# Altium footprint library PcbLib.PcbLib: 68 footprints (part 5 of 5)
Each footprint in its own frame and in the unit in brackets; x right, y up, seen from the top. Pads: shape width x height; smd on the part's side, far side on the other; paste and mask are expansions set on the pad; w line width, h text height; cw(c..) or ccw(c..) is an arc to the next point about the centre after c.
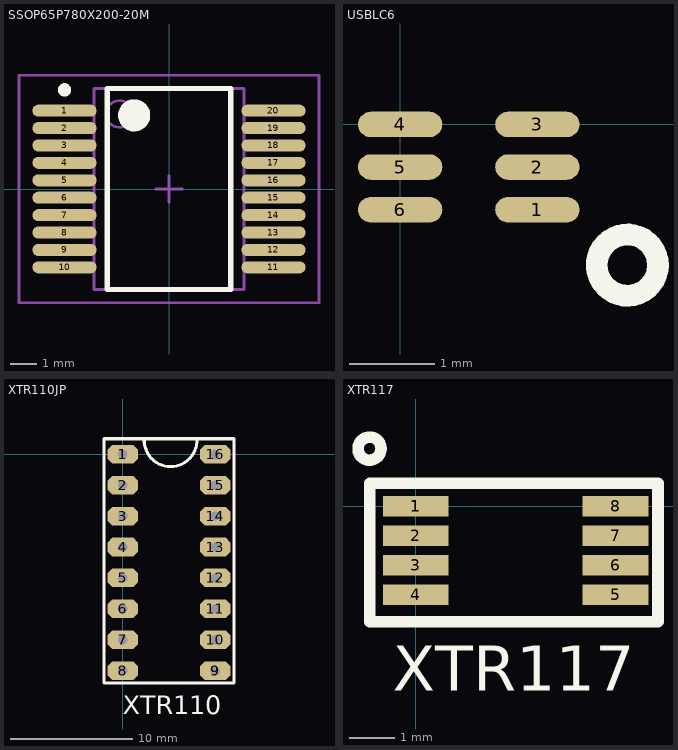
[diagram p4: the footprints below, top view; thin cyan lines are the x and y axes]

## SSOP65P780X200-20M [mm] "SOP, 20-Leads, Body 7.5x5.6mm (max), Pitch 0.65mm, IPC Low Density"
height 2
pads (20):
  oval 2.4x0.45 smd: 1(-3.9,2.925) 2(-3.9,2.275) 3(-3.9,1.625) 4(-3.9,0.975) 5(-3.9,0.325) 6(-3.9,-0.325) 7(-3.9,-0.975) 8(-3.9,-1.625) 9(-3.9,-2.275) 10(-3.9,-2.925) 11(3.9,-2.925) 12(3.9,-2.275) 13(3.9,-1.625) 14(3.9,-0.975) 15(3.9,-0.325) 16(3.9,0.325) 17(3.9,0.975) 18(3.9,1.625) 19(3.9,2.275) 20(3.9,2.925)
Top Overlay:
  circle w0.25: c-3.9,3.7 r0.125
  circle w0.6: c-1.3,2.75 r0.3
  lines w0.2: -2.3,-3.75 -2.3,3.75 2.3,3.75 2.3,-3.75 -2.3,-3.75
Mechanical 13:
  circle w0.1: c-1.85,2.8 r0.5
  lines w0.1: -2.8,-3.75 -2.8,3.75 2.8,3.75 2.8,-3.75 -2.8,-3.75
Mechanical 15:
  lines w0.1: -0.5,0 0.5,0 ; 0,-0.5 0,0.5 ; -5.6,-4.25 -5.6,4.25 5.6,4.25 5.6,-4.25 -5.6,-4.25
3D body "User Library-SSOP 20 PIN.step": height 1.93, standoff -0.06, extent -3.95,-3.25 3.95,3.25

## USBLC6 [mm]
pads (6):
  oval 0.99x0.3 smd: 1(1.61,-1) 2(1.61,-0.5) 3(1.61,0) 4(0,0) 5(0,-0.5) 6(0,-1)
Top Overlay:
  circle w0.254: c2.667,-1.651 r0.359

## XTR110JP [mil] "Voltage to current converter"
pads (18):
  oct 99.37x60 hole 30: 1(0,0) 1(0,0) 2(0,-100) 3(0,-200) 4(0,-300) 5(0,-400) 6(0,-500) 7(0,-600) 8(0,-700) 9(300,-700) 9(300,-700) 10(300,-600) 11(300,-500) 12(300,-400) 13(300,-300) 14(300,-200) 15(300,-100) 16(300,0)
Top Overlay:
  lines w10: 70,50 ccw(c155,45) 240,50 ; -60,-740 360,-740 360,50 -50,50 -60,50 -60,-740
  text "XTR110" at 0,-840 h60

## XTR117 [mm] "4-20 mA Transmitter"
pads (9):
  rect 1.45x0.45 on Top Paste: 1(0,0)
  rect 1.45x0.45 smd: 1(0,0) 2(0,-0.65) 3(0,-1.3) 4(0,-1.95) 5(4.4,-1.95) 6(4.4,-1.3) 7(4.4,-0.65) 8(4.4,0)
Top Overlay:
  circle w0.254: c-1.016,1.27 r0.254
  lines w0.254: -1.016,-2.54 -1.016,0.508 5.334,0.508 5.334,-2.54 -1.016,-2.54
  text "XTR117" at -0.508,-4.064 h1